# Altium footprint library negm_library.PcbLib: 39 footprints (part 1 of 3)
Each footprint in its own frame and in the unit in brackets; x right, y up, seen from the top. Pads: shape width x height; smd on the part's side, far side on the other; paste and mask are expansions set on the pad; w line width, h text height; cw(c..) or ccw(c..) is an arc to the next point about the centre after c.
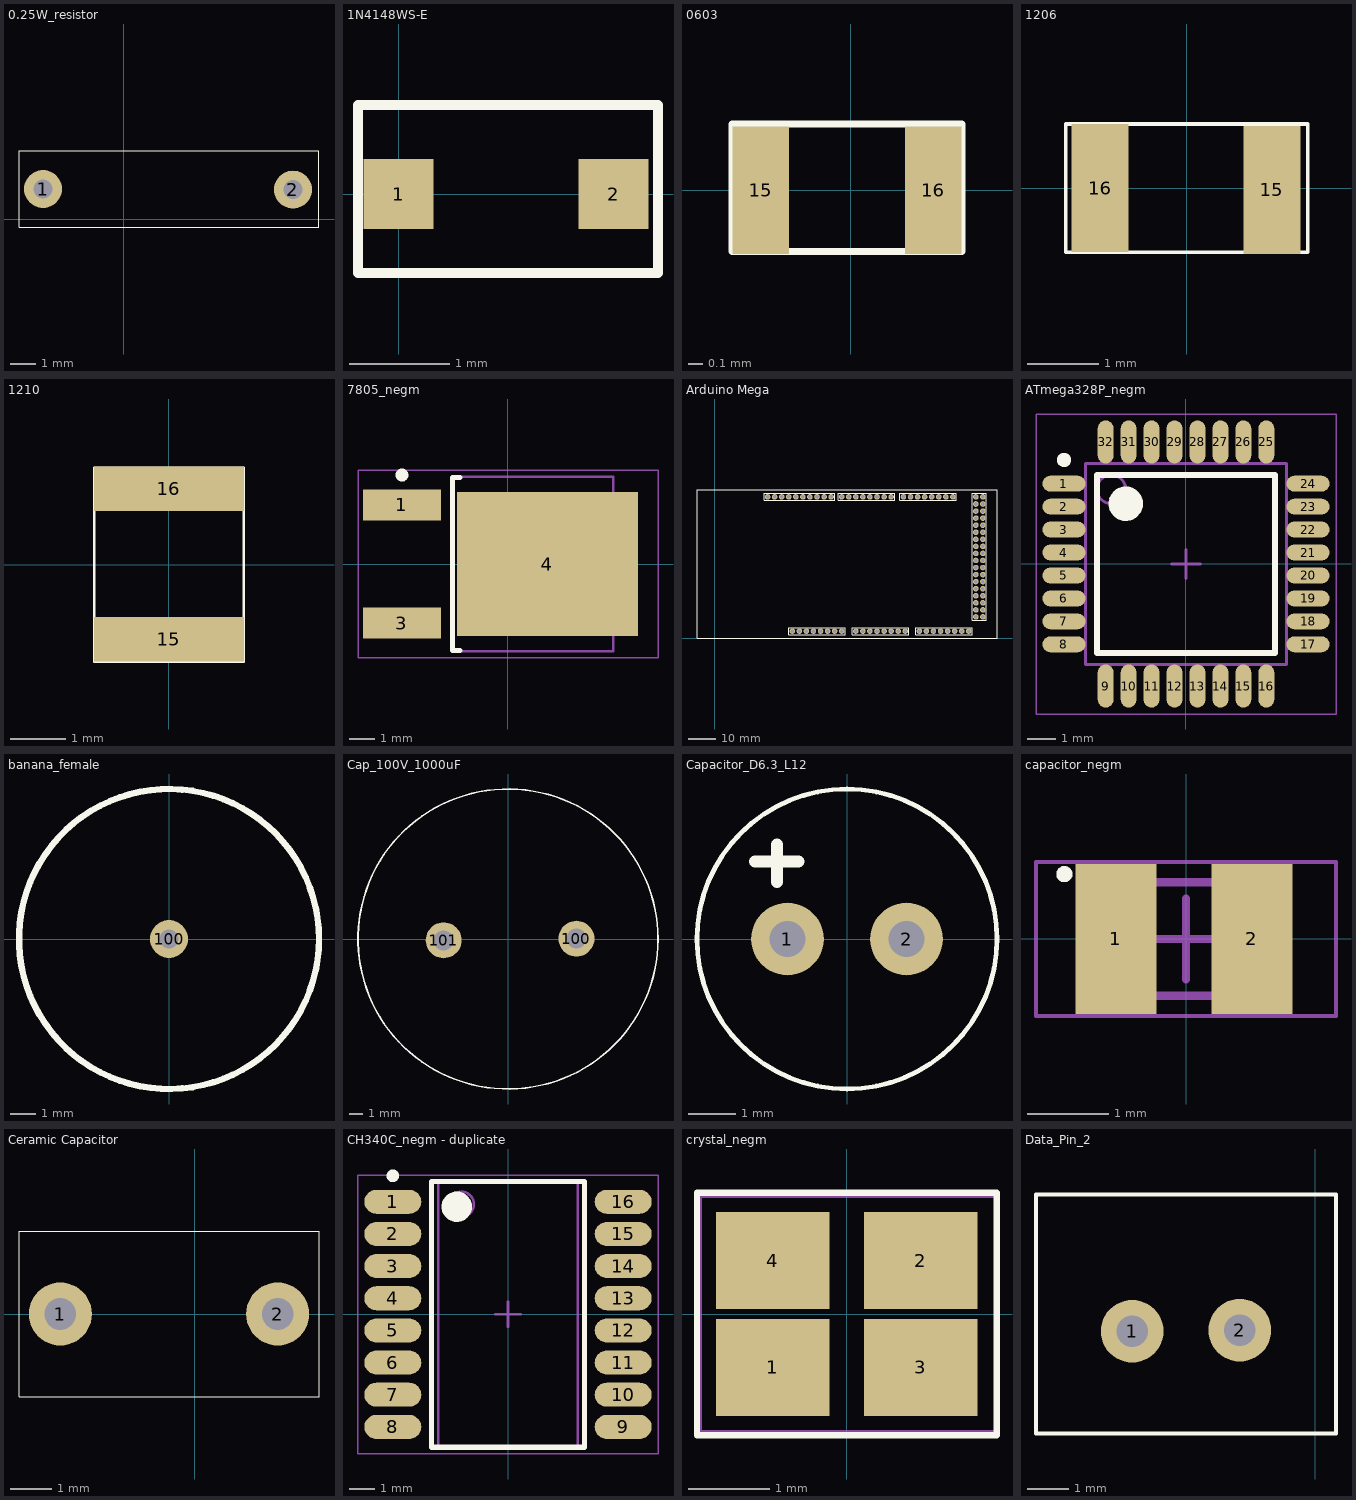
[diagram p0: the footprints below, top view; thin cyan lines are the x and y axes]

## 0.25W_resistor [mil]
pads (2):
  round 60 hole 30: 1(-127,48) 2(267,47)
Top Overlay:
  lines w0.39: -165,-12 308,-12 308,108 -165,108 -165,-12
3D body "User Library-AXIAL_RESISTOR(0_25W).STEP": height 161.7, standoff 0.5, extent -142.6,0.51 282.6,95

## 1N4148WS-E [mm] "FAST SWITHING DIODE"
pads (2):
  rect 0.7x0.7 smd: 1(0,0) 2(2.15,0)
Top Overlay:
  lines w0.1: -0.406,-0.787 2.594,-0.787 2.594,0.889 -0.406,0.889 -0.406,-0.787
3D body "User Library-SOD-323.STEP": height 1.1, standoff 0, extent -0.233,-0.624 2.367,0.726

## 0603 [mm] "100mW Thick Film Resistors 75V ±100ppm/℃ ±1% 100kΩ 0603 Chip Resistor - Surface Mount ROHS"
pads (2):
  rect 0.4x0.9 smd: 15(-0.635,0) 16(0.584,0)
Top Overlay:
  lines w0.05: -0.836,-0.432 0.787,-0.432 0.787,0.468 -0.836,0.468 -0.836,-0.432
3D body "CircuitWorks-RESISTOR 0603.STEP": height 0.48, standoff -0.03, extent -0.825,-0.405 0.775,0.455

## 1206 [mm] "125mW Thin Film Resistor 150V ±5ppm/℃ ±0.05% 49.9kΩ 1206 Chip Resistor - Surface Mount ROHS"
pads (2):
  rect 0.8x1.8 smd: 15(1.194,-0.025) 16(-1.219,0)
Top Overlay:
  lines w0.05: -1.7,-0.9 1.7,-0.9 1.7,0.9 -1.7,0.9 -1.7,-0.9
3D body "CircuitWorks-RESISTOR 1206.STEP": height 0.53, standoff -0.03, extent -1.625,-0.83 1.575,0.83

## 1210 [mm] "250mW Thin Film Resistor ±0.1% ±10ppm/℃ 448kΩ 1210 Chip Resistor - Surface Mount ROHS"
pads (2):
  rect 2.7x0.8 smd: 15(0,-1.346) 16(0,1.372)
Top Overlay:
  lines w0.05: -1.35,-1.75 1.35,-1.75 1.35,1.75 -1.35,1.75 -1.35,-1.75
3D body "RESISTOR 1210 (2).stp": height 0.55, standoff 0, extent -1.3,-1.525 1.3,1.575

## 7805_negm [mm] "68dB@(120Hz) 1A Fixed 5V Positive electrode 35V TO-252-2(DPAK) Voltage Regulators - Linear, Low Drop Out (LDO) Regulators ROHS(D-PAK, 3-Pads, Body 6.21x6.73mm (max), IPC Medium Density)"
height 2.38
pads (3):
  rect 3x1.2 smd: 1(-4.1,2.29) 3(-4.1,-2.29)
  rect 7x5.55 smd: 4(1.524,0)
Top Overlay:
  circle w0.25: c-4.1,3.44 r0.125
  lines w0.2: -1.85,-3.35 -2.15,-3.35 -2.15,3.35 -1.85,3.35
Mechanical 13:
  lines w0.1: -2.15,-3.375 4.07,-3.375 4.07,3.375 -2.15,3.375 -2.15,-3.375
Mechanical 15:
  lines w0.05: -5.8,-3.625 5.8,-3.625 5.8,3.625 -5.8,3.625 -5.8,-3.625
  lines w0.1: -0.5,0 0.5,0 ; 0,-0.5 0,0.5
Multi-Layer:
  text ".Designator" at -2.171,-4.282 h0.52
3D body "7805_negm.step": height 2.99, standoff 0, extent -4.19,-3.375 5.715,3.375

## Arduino Mega [mm] "bottom layerc"
pads (86):
  round 2 hole 1.3: 3.3V(35.56,2.54) 5V(38.1,2.54) 5V(93.98,50.8) 5V(96.52,50.8) 22(93.98,48.26) 23(96.52,48.26) 24(93.98,45.72) 25(96.52,45.72) 26(93.98,43.18) 27(96.52,43.18) 28(93.98,40.64) 29(96.52,40.64) 30(93.98,38.1) 31(96.52,38.1) 32(93.98,35.56) 33(96.52,35.56) 34(93.98,33.02) 35(96.52,33.02) 36(93.98,30.48) 37(96.52,30.48) 38(93.98,27.94) 39(96.52,27.94) 40(93.98,25.4) 41(96.52,25.4) 42(93.98,22.86) 43(96.52,22.86) 44(93.98,20.32) 45(96.52,20.32) 46(93.98,17.78) 47(96.52,17.78) 48(93.98,15.24) 49(96.52,15.24) 50(93.98,12.7) 51(96.52,12.7) 52(93.98,10.16) 53(96.52,10.16) A_0(50.8,2.54) A_1(53.34,2.54) A_2(55.88,2.54) A_3(58.42,2.54) A_4(60.96,2.54) A_5(63.5,2.54) A_6(66.04,2.54) A_7(68.58,2.54) A_8(73.66,2.54) A_9(76.2,2.54) A_10(78.74,2.54) A_11(81.28,2.54) A_12(83.82,2.54) A_13(86.36,2.54) A_14(88.9,2.54) A_15(91.44,2.54) GND(26.67,50.8) GND(40.64,2.54) GND(43.18,2.54) GND(93.98,7.62) GND(96.52,7.62) HOLD(27.94,2.54) PWM_2(58.42,50.8) PWM_3(55.88,50.8) PWM_4(53.34,50.8) PWM_5(50.8,50.8) PWM_6(48.26,50.8) PWM_7(45.72,50.8) PWM_8(41.91,50.8) PWM_9(39.37,50.8) PWM_10(36.83,50.8) PWM_11(34.29,50.8) PWM_12(31.75,50.8) PWM_13(29.21,50.8) REF(24.13,50.8) REF_I/O(30.48,2.54) RST(33.02,2.54) Rx_0(63.5,50.8) Rx_15(70.485,50.8) Rx_17(75.565,50.8) Rx_19(80.645,50.8) SCL(19.05,50.8) SCL_21(85.725,50.8) SDA(21.59,50.8) SDA_20(83.185,50.8) Tx_1(60.96,50.8) Tx_14(67.945,50.8) Tx_16(73.025,50.8) Tx_18(78.105,50.8) Vin(45.72,2.54)
Top Overlay:
  lines w0.254: -6.35,0 101.6,0 101.6,53.34 -6.35,53.34 -6.35,0 ; 17.78,49.53 43.18,49.53 43.18,52.07 17.78,52.07 17.78,49.53 ; 26.67,1.27 46.99,1.27 46.99,3.81 26.67,3.81 26.67,1.27 ; 44.45,49.53 64.77,49.53 64.77,52.07 44.45,52.07 44.45,49.53 ; 49.53,1.27 69.85,1.27 69.85,3.81 49.53,3.81 49.53,1.27 ; 66.675,49.53 86.995,49.53 86.995,52.07 66.675,52.07 66.675,49.53 ; 72.39,1.27 92.71,1.27 92.71,3.81 72.39,3.81 72.39,1.27 ; 92.71,6.35 97.79,6.35 97.79,52.07 92.71,52.07 92.71,6.35
3D body "8_pin_header_12.4_.stp": height 3.78, standoff -8.62, extent 72.39,1.291 92.71,3.789
3D body "8_pin_header_12.4_.stp": height 3.78, standoff -8.62, extent 66.675,49.572 86.995,52.07
3D body "8_pin_header_12.4_.stp": height 3.78, standoff -8.62, extent 49.53,1.291 69.85,3.789
3D body "8_pin_header_12.4_.stp": height 3.78, standoff -8.62, extent 26.67,1.291 46.99,3.789
3D body "18x2-pin_header_.stp": height 3, standoff -8.5, extent 92.71,6.35 97.79,52.07
3D body "ARDUINO_MEGA_2560.STEP": height 15.3, standoff 0.05, extent -6.35,0 101.6,53.34
3D body "8_pin_header_12.4_.stp": height 3.78, standoff -8.62, extent 44.45,49.551 64.77,52.049
3D body "10-pin_header.stp": height 3.78, standoff -8.62, extent 17.78,49.551 43.18,52.049

## ATmega328P_negm [mm] "TQFP, 32-Leads, Body 7.00x7.00mm, Pitch 0.80mm, IPC Medium Density_ATmega328P_negm_\  32KB 2KB FLASH 23 1.8V~5.5V AVR 20MHz TQFP-32(7x7) Microcontrollers (MCU/MPU/SOC) ROHS"
height 1.2
pads (32):
  oval 1.5x0.55 smd: 1(-4.25,2.8) 2(-4.25,2) 3(-4.25,1.2) 4(-4.25,0.4) 5(-4.25,-0.4) 6(-4.25,-1.2) 7(-4.25,-2) 8(-4.25,-2.8) 17(4.25,-2.8) 18(4.25,-2) 19(4.25,-1.2) 20(4.25,-0.4) 21(4.25,0.4) 22(4.25,1.2) 23(4.25,2) 24(4.25,2.8)
  oval 0.55x1.5 smd: 9(-2.8,-4.25) 10(-2,-4.25) 11(-1.2,-4.25) 12(-0.4,-4.25) 13(0.4,-4.25) 14(1.2,-4.25) 15(2,-4.25) 16(2.8,-4.25) 25(2.8,4.25) 26(2,4.25) 27(1.2,4.25) 28(0.4,4.25) 29(-0.4,4.25) 30(-1.2,4.25) 31(-2,4.25) 32(-2.8,4.25)
Top Overlay:
  circle w0.6: c-2.1,2.1 r0.3
  circle w0.25: c-4.25,3.625 r0.125
  lines w0.2: -3.1,-3.1 3.1,-3.1 3.1,3.1 -3.1,3.1 -3.1,-3.1
Mechanical 13:
  circle w0.1: c-2.6,2.6 r0.5
  lines w0.1: -3.5,-3.5 3.5,-3.5 3.5,3.5 -3.5,3.5 -3.5,-3.5
Mechanical 15:
  lines w0.05: -5.225,-5.225 5.225,-5.225 5.225,5.225 -5.225,5.225 -5.225,-5.225
  lines w0.1: -0.5,0 0.5,0 ; 0,-0.5 0,0.5
3D body "ATmega328P_negm.step": height 1.2, standoff 0, extent -4.5,-4.5 4.5,4.5

## banana_female [mil] "banana_female"
pads (1):
  round 60 hole 30: 100(0,0)
Top Overlay:
  circle w10: c0,0 r236.22
3D body "User Library-red banana jack.STEP": height 640.5, standoff -249.5, extent -209.5,-217.5 227.5,219.5

## Cap_100V_1000uF [mm] "1000uF 100V ±20% 1.47A@100kHz Plugin,D22xL30mm Aluminum Electrolytic Capacitors - Leaded ROHS"
pads (2):
  round 2.7 hole 1.5: 100(5.131,0.025) 101(-4.826,-0.102)
Top Overlay:
  circle w0.125: c0,0 r11.25
3D body "User Library-CEL225D10P31H.STEP": height 31, standoff -5.1, extent -11.225,-11.275 11.275,11.225

## Capacitor_D6.3_L12 [mil] "Capacitor 10uF/22uF 100V"
pads (2):
  round 60 hole 30: 1(-49.21,0) 2(49.21,0)
Top Overlay:
  circle w3.94: c0,0 r124.02
  lines w10: -76,64 -40,64 -54.38,64 ccw(c-54.38,58.88) -58,62.5 -58,47 -58,78
3D body "1815472.stp": height 433.64, standoff -786.96, extent -124.02,-124.02 124.02,124.61

## capacitor_negm [mm] "Molded Capacitor, 2-Leads, Body 2.00x1.25mm, IPC Medium Density_10V 10uF X7R ±20% 0805 Multilayer Ceramic Capacitors MLCC - SMD/SMT ROHS"
height 1.8
pads (2):
  rect 1x1.85 smd: 1(-0.864,0) 2(0.813,0)
Top Overlay:
  circle w0.1: c-1.5,0.8 r0.05
Mechanical 13:
  rectangle: -1.1,-0.7 -0.804,0.7
  lines w0.1: -1.1,-0.7 1.1,-0.7 1.1,0.7 -1.1,0.7 -1.1,-0.7
Mechanical 15:
  lines w0.05: -1.85,-0.95 1.85,-0.95 1.85,0.95 -1.85,0.95 -1.85,-0.95
  lines w0.1: -0.5,0 0.5,0 ; 0,-0.5 0,0.5
3D body "capacitor_negm.step": height 1.8, standoff 0, extent -1.32,-0.7 1.32,0.7

## Ceramic Capacitor [mil] "el 3adsaia / 10nF,100nF,100pF"
pads (2):
  round 60 hole 30: 1(-127.95,0) 2(78.74,0)
Top Overlay:
  lines w0.39: -167.32,-78.74 118.11,-78.74 118.11,78.74 -167.32,78.74 -167.32,-78.74
3D body "c322c104k1r5ta.stp": height 536.61, standoff 0.43, extent -133.06,-62.7 88.58,62.7

## CH340C_negm - duplicate [mm] "SOIC, 16-Leads, Body 10.30x5.30mm, Pitch 1.27mm, IPC Medium Density_  SOP-16 USB Converters ROHS"
height 2.65
pads (16):
  oval 2.25x0.95 smd: 1(-4.55,4.445) 2(-4.55,3.175) 3(-4.55,1.905) 4(-4.55,0.635) 5(-4.55,-0.635) 6(-4.55,-1.905) 7(-4.55,-3.175) 8(-4.55,-4.445) 9(4.55,-4.445) 10(4.55,-3.175) 11(4.55,-1.905) 12(4.55,-0.635) 13(4.55,0.635) 14(4.55,1.905) 15(4.55,3.175) 16(4.55,4.445)
Top Overlay:
  circle w0.6: c-2.025,4.25 r0.3
  circle w0.25: c-4.55,5.47 r0.125
  lines w0.2: -3.025,-5.25 3.025,-5.25 3.025,5.25 -3.025,5.25 -3.025,-5.25
Mechanical 13:
  circle w0.1: c-1.85,4.35 r0.5
  lines w0.1: -2.75,-5.25 2.75,-5.25 2.75,5.25 -2.75,5.25 -2.75,-5.25
Mechanical 15:
  lines w0.05: -5.925,-5.5 5.925,-5.5 5.925,5.5 -5.925,5.5 -5.925,-5.5
  lines w0.1: -0.5,0 0.5,0 ; 0,-0.5 0,0.5
3D body "CH340C_negm.step": height 2.65, standoff 0, extent -5.15,-5.25 5.15,5.25

## crystal_negm [mm] "16MHz SMD crystal oscillator 12pF ±10ppm ±20ppm SMD3225-4P Crystals ROHS"
pads (4):
  rect 1.4x1.2 all layers, no hole: 1(-0.914,-0.66) 2(0.914,0.66) 3(0.914,-0.66) 4(-0.914,0.66)
Top Layer:
  text ".Designator" at -2.161,4.483 h0.5
Top Overlay:
  lines w0.08: -1.85,-1.5 -1.85,1.5 1.85,1.5 1.85,-1.5 -1.85,-1.5
Mechanical29:
  lines w0.08: -1.829,-1.473 1.854,-1.473 1.854,1.473 -1.829,1.473 -1.829,-1.473
3D body "User Library-SMD-3225_4P_crystal.step": height 1.05, standoff 0, extent -1.6,-1.25 1.6,1.25

## Data_Pin_2 [mil]
pads (2):
  round 60 hole 30: 1(-175,275) 2(-72,276)
Top Overlay:
  lines w3.94: -267,177 20,177 20,406 -267,406 -267,177
3D body "JST - XH - Thru (V) - 2Pin - 2.54mm.stp": height 284, standoff -118, extent -268,173 16,403